# Altium footprint library PcbLib1.PcbLib: 45 footprints (part 1 of 3)
Each footprint in its own frame and in the unit in brackets; x right, y up, seen from the top. Pads: shape width x height; smd on the part's side, far side on the other; paste and mask are expansions set on the pad; w line width, h text height; cw(c..) or ccw(c..) is an arc to the next point about the centre after c.
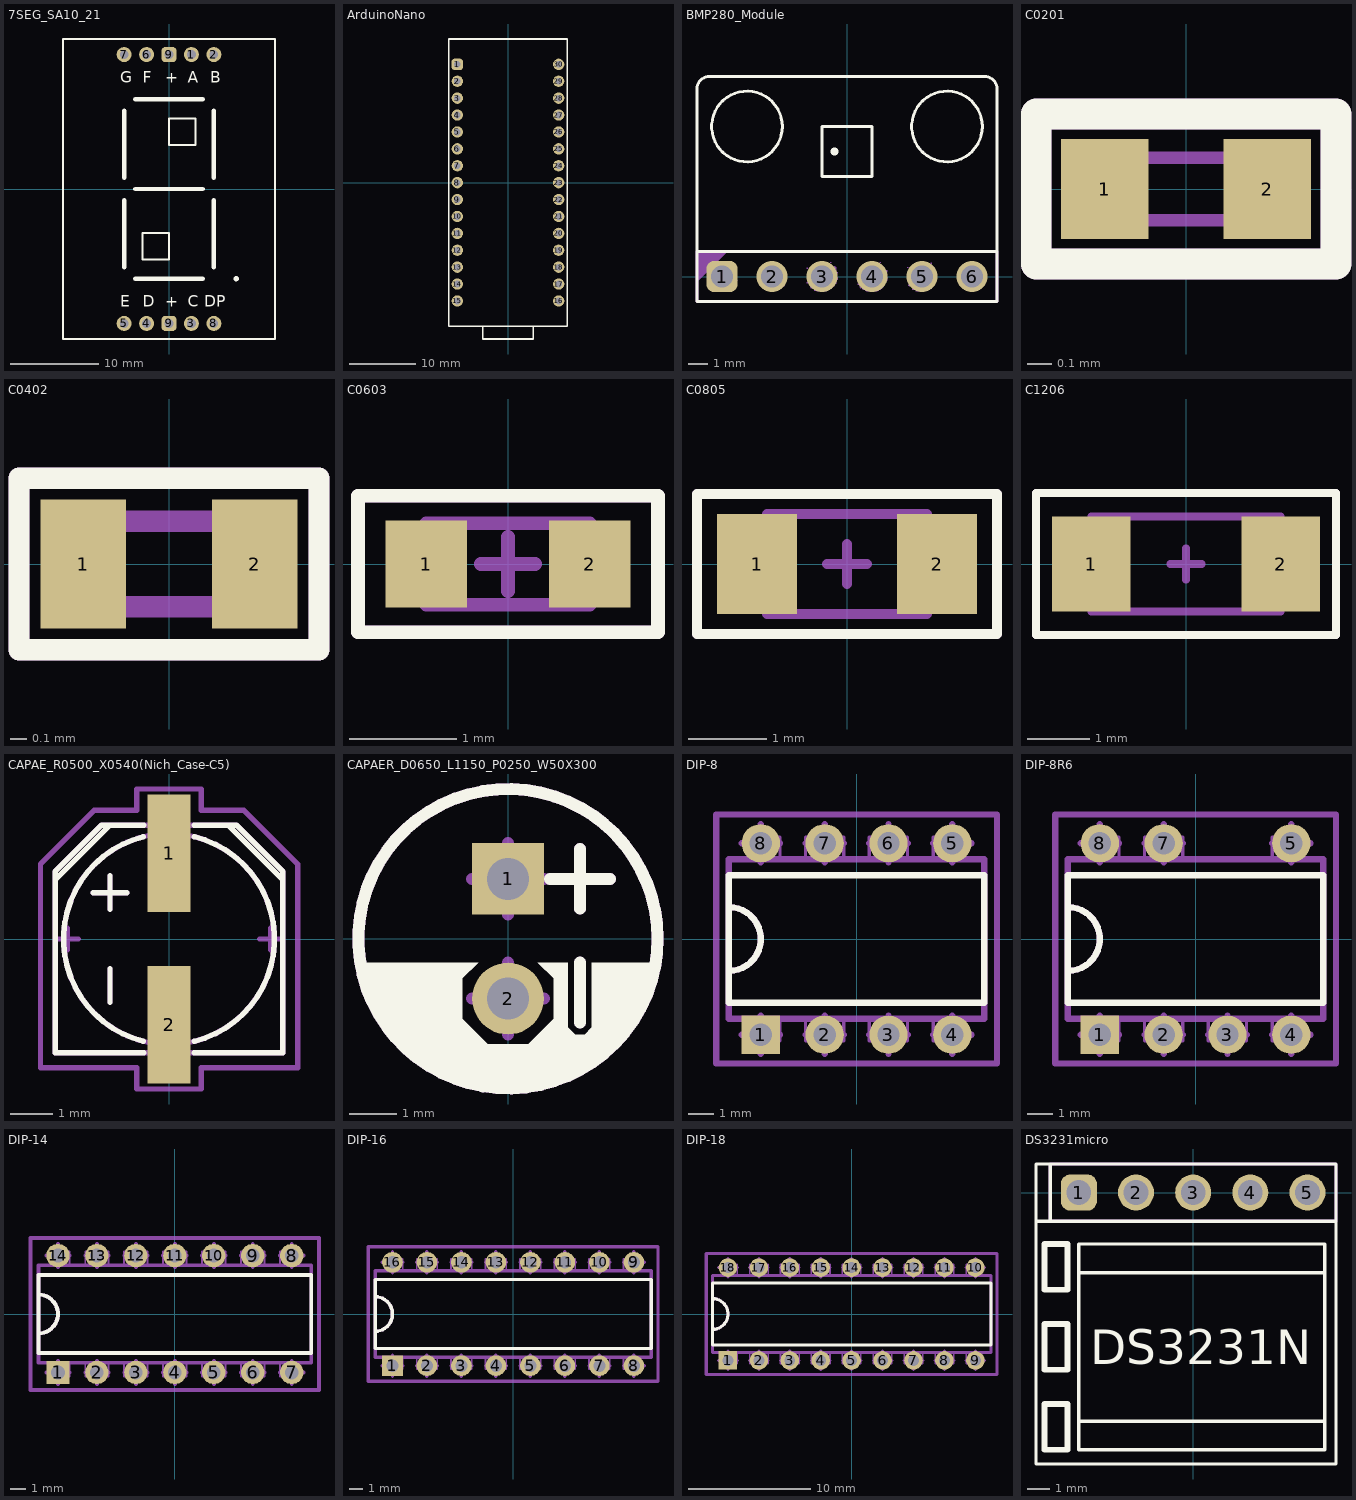
[diagram p0: the footprints below, top view; thin cyan lines are the x and y axes]

## 7SEG_SA10_21 [mm]
pads (10):
  round 1.7 hole 1: 1(2.54,15.24) 2(5.08,15.24) 3(2.54,-15.24) 4(-2.54,-15.24) 5(-5.08,-15.24) 6(-2.54,15.24) 7(-5.08,15.24) 8(5.08,-15.24)
  rrect50% 1.7x1.7 hole 1: 9(0,-15.24) 9(0,15.24)
Top Overlay:
  circle w0.305: c7.62,-10.16 r0.152
  lines w0.254: -12,-17 12,-17 12,17 -12,17 -12,-17 ; -3,-8 -3,-5 0,-5 0,-8 -3,-8 ; 0,5 0,8 3,8 3,5 0,5
  lines w0.508: -5.08,-8.89 -5.08,-1.27 ; -5.08,1.27 -5.08,8.89 ; -3.81,-10.16 3.81,-10.16 ; -3.81,0 3.81,0 ; -3.81,10.16 3.81,10.16 ; 5.08,-8.89 5.08,-1.27 ; 5.08,1.27 5.08,8.89
  text "A" at 2.117,12.065 h1.27
  text "B" at 4.657,12.065 h1.27
  text "C" at 2.117,-13.335 h1.27
  text "D" at -2.963,-13.335 h1.27
  text "E" at -5.503,-13.335 h1.27
  text "F" at -2.963,12.065 h1.27
  text "G" at -5.503,12.065 h1.27
  text "DP" at 4.022,-13.335 h1.27
  text "+" at -0.423,12.065 h1.27
  text "+" at -0.423,-13.335 h1.27

## ArduinoNano [mm]
pads (30):
  rrect50% 1.7x1.7 hole 1: 1(-7.62,17.78)
  round 1.7 hole 1: 2(-7.62,15.24) 3(-7.62,12.7) 4(-7.62,10.16) 5(-7.62,7.62) 6(-7.62,5.08) 7(-7.62,2.54) 8(-7.62,0) 9(-7.62,-2.54) 10(-7.62,-5.08) 11(-7.62,-7.62) 12(-7.62,-10.16) 13(-7.62,-12.7) 14(-7.62,-15.24) 15(-7.62,-17.78) 16(7.62,-17.78) 17(7.62,-15.24) 18(7.62,-12.7) 19(7.62,-10.16) 20(7.62,-7.62) 21(7.62,-5.08) 22(7.62,-2.54) 23(7.62,0) 24(7.62,2.54) 25(7.62,5.08) 26(7.62,7.62) 27(7.62,10.16) 28(7.62,12.7) 29(7.62,15.24) 30(7.62,17.78)
Top Overlay:
  lines w0.15: 3.175,21.59 3.81,21.59
  lines w0.254: -3.81,-21.59 -3.81,-23.495 3.81,-23.495 3.81,-21.59 ; -8.89,-21.59 -8.89,21.59 8.89,21.59 8.89,-21.59 -8.89,-21.59
  text "." at -9.525,18.415 h0.1
3D body "arduino_nano.STEP": height 12.6, standoff -6, extent -9,-23.4 9,21.6

## BMP280_Module [mm]
pads (6):
  rrect50% 1.6x1.6 hole 1.1: 1(-6.35,0)
  round 1.6 hole 1.1: 2(-3.81,0) 3(-1.27,0) 4(1.27,0) 5(3.81,0) 6(6.35,0)
Top Overlay:
  circle w0.15: c-5.08,7.62 r1.796
  circle w0.15: c5.08,7.62 r1.796
  circle w0.381: c-0.635,6.35 r0.003
  lines w0.15: -7.62,1.27 -7.62,9.525 cw(c-6.985,9.525) -6.985,10.16 6.985,10.16 cw(c6.985,9.525) 7.62,9.525 7.62,1.27 ; -7.62,1.27 -7.62,-1.27 7.62,-1.27 7.62,1.27 ; -7.62,1.27 7.62,1.27 ; -1.27,5.08 1.27,5.08 1.27,7.62 -1.27,7.62 -1.27,5.08
Top Courtyard:
  drawing of 113 lines, arcs and shapes, not listed
Top Designator:
  text ".Designator" at -3.999,-0.267 h0.8
Mechanical 29:
  region: -7.62,1.27 -6.096,1.27 -7.62,-0.254
  lines w0.15: -7.62,-1.27 7.62,-1.27 7.62,1.27 -7.62,1.27 -7.62,-1.27
  text ".Designator" at -3.5,-0.3 h1
3D body "PLS-1.STEP": height 8.5, standoff -3, extent -7.62,-1.27 -5.08,1.27
3D body "PLS-1.STEP": height 8.5, standoff -3, extent -5.08,-1.27 -2.54,1.27
3D body "PLS-1.STEP": height 8.5, standoff -3, extent -2.54,-1.27 0,1.27
3D body "PLS-1.STEP": height 8.5, standoff -3, extent 0,-1.27 2.54,1.27
3D body "PLS-1.STEP": height 8.5, standoff -3, extent 2.54,-1.27 5.08,1.27
3D body "PLS-1.STEP": height 8.5, standoff -3, extent 5.08,-1.27 7.62,1.27

## C0201 [mil]
pads (2):
  rect 14x16 smd: 1(-13,0) 2(13,0)
Top Overlay:
  lines w5: -24,-12 24,-12 24,12 -24,12 -24,-12
Bottom 3D Body:
  lines w2: -10,-5 -10,5 10,5 10,-5 -10,-5
  text "'.Designator'" at -8,-2.5 h8
Mechanical 15:
  lines w5: -24,-12 -24,12 24,12 24,-12 -24,-12
3D body "0201C.STEP": height 11.81, standoff 0, extent -11.8,-5.9 11.82,5.91

## C0402 [mil]
pads (2):
  rect 20x30 smd: 1(-20,0) 2(20,0)
Top Overlay:
  lines w5: -35,-20 35,-20 35,20 -35,20 -35,-20
Bottom 3D Body:
  lines w5: -20,-10 20,-10 20,10 -20,10 -20,-10
  text "'.Designator'" at -14,-4 h15
Mechanical 15:
  lines w5: -35,-20 -35,20 35,20 35,-20 -35,-20
3D body "0402C.STEP": height 19.68, standoff 0, extent -19.68,-9.84 19.69,9.85

## C0603 [mil]
pads (2):
  rect 30x32 smd: 1(-30,0) 2(30,0)
Top Overlay:
  lines w5: -55,-25 -55,25 55,25 55,-25 -55,-25
Bottom 3D Body:
  lines w5: -30,-15 30,-15 30,15 -30,15 -30,-15
  text "'.Designator'" at -25,-10 h30
Mechanical 11:
  lines w5: -10,0 10,0 ; 0,-10 0,10
Mechanical 15:
  lines w5: -55,-25 55,-25 55,25 -55,25 -55,-25
3D body "User Library-cap_0603.STEP": height 31.5, standoff 0, extent -31.49,-15.74 31.5,15.75

## C0805 [mil]
pads (2):
  rect 40x50 smd: 1(-45,0) 2(45,0)
Top Overlay:
  lines w5: -75,-35 -75,35 75,35 75,-35 -75,-35
Bottom 3D Body:
  lines w5: -40,-25 -40,25 40,25 40,-25 -40,-25
  text "'.Designator'" at -35,-10 h40
Mechanical 11:
  lines w5: -10,0 10,0 ; 0,-10 0,10
Mechanical 15:
  lines w5: -75,-35 -75,35 75,35 75,-35 -75,-35
3D body "User Library-cap_0805.STEP": height 47.24, standoff 0, extent -39.36,-23.62 39.38,23.63

## C1206 [mil]
pads (2):
  rect 50x60 smd: 1(-60,0) 2(60,0)
Top Overlay:
  lines w5: -95,-45 95,-45 95,45 -95,45 -95,-45
Bottom 3D Body:
  lines w5: -60,-30 60,-30 60,30 -60,30 -60,-30
  text "'.Designator'" at -50,-10 h40
Mechanical 11:
  lines w5: -10,0 10,0 ; 0,-10 0,10
Mechanical 15:
  lines w5: -95,-45 95,-45 95,45 -95,45 -95,-45
3D body "User Library-cap_1206.STEP": height 62.99, standoff 0, extent -62.99,-31.49 63,31.5

## CAPAE_R0500_X0540(Nich_Case-C5) [mil]
pads (2):
  rect 40x110 smd: 1(0,80) 2(0,-80)
Top Overlay:
  lines w5: -106.3,55.12 -55.12,106.3 ; -70.87,43.31 -39.37,43.31 ; -55.12,-59.06 -55.12,-27.56 ; -55.12,27.56 -55.12,59.06 ; -23.87,-95.49 cw(c0,0) -23.87,95.49 ; -23.62,-106.3 -106.3,-106.3 -106.3,62.99 -62.99,106.3 -23.62,106.3 ; 23.62,-106.3 106.3,-106.3 106.3,62.99 62.99,106.3 23.62,106.3 ; 23.64,-95.54 ccw(c0,0) 23.64,95.54 ; 55.12,106.3 106.3,55.12
Bottom 3D Body:
  circle w5: c0,0 r98.43
  lines w2: -12.8,-106.3 -12.8,-120.08 12.8,-120.08 12.8,-106.3 ; -12.8,106.3 -12.8,120.08 12.8,120.08 12.8,106.3
  lines w5: -70.87,43.31 -39.37,43.31 ; -55.12,-59.06 -55.12,-27.56 ; -55.12,27.56 -55.12,59.06 ; -106.3,-106.3 -106.3,62.99 -62.99,106.3 62.99,106.3 106.3,62.99 106.3,-106.3 -106.3,-106.3
  text "'.Designator'" at 59.06,-78.74 h60
Mechanical 11:
  lines w5: -104.69,0 -84.69,0 ; -94.69,-10 -94.69,10 ; 84.69,0 104.69,0 ; 94.69,-10 94.69,10
Mechanical 15:
  lines w5: -120,-120 -120,70 -69.92,120.08 -30,120.08 -30,140 30,140 30,120.08 69.92,120.08 120,70 120,-120 30,-120 30,-140 -30,-140 -30,-120 -120,-120
3D body "C5(D0500H0540).STEP": height 212.99, standoff 0, extent -104.33,-118.11 104.33,118.11

## CAPAER_D0650_L1150_P0250_W50X300 [mil]
pads (2):
  rect 60x60 hole 35: 1(0,50)
  round 60 hole 35: 2(0,-50)
Top Overlay:
  circle w10: c0,0 r125
  region: 124,-20 70,-20 70,-74 64,-80 56,-80 50,-74 50,-20 25,-20 38,-33 38,-67 17,-88 -17,-88 -38,-67 -38,-33 -25,-20 -123,-20 -105,-70 -60,-110 0.5,-125.5 60,-110 106,-70
  lines w10: 35,50 85,50 ; 60,-70 60,-20 ; 60,25 60,75
Bottom 3D Body:
  circle w10: c0,0 r125
  lines w10: 35,50 85,50 ; 60,-70 60,-20 ; 60,25 60,75
  text "'.Designator'" at -80,70 h60
Mechanical 15:
  circle w10: c0,0 r125
Mechanical 25:
  lines w10: -30,-50 30,-50 ; -30,50 30,50 ; 0,-80 0,-20 ; 0,20 0,80
Mechanical 26:
  lines w10: -30,-50 30,-50 ; -30,50 30,50 ; 0,-80 0,-20 ; 0,20 0,80
3D body "User Library-CAPAER_D063_L115_P025_W005X030.STEP": height 453.28, standoff -118.11, extent -124.01,-124.41 124.02,124.01

## DIP-8 [mil]
pads (8):
  rect 60x60 hole 35: 1(-150,-150)
  round 60 hole 35: 2(-50,-150) 3(50,-150) 4(150,-150) 5(150,150) 6(50,150) 7(-50,150) 8(-150,150)
Top Overlay:
  lines w10: -200,-50 ccw(c-200,0) -200,50 ; -200,-100 -200,100 200,100 200,-100 -200,-100
Bottom 3D Body:
  lines w5: -160,-125 -160,-160 -120,-160 -120,-125 ; -160,125 -160,160 -120,160 -120,125 ; -80,-125 -80,-160 -20,-160 -20,-125 ; -80,125 -80,160 -20,160 -20,125 ; 20,-125 20,-160 80,-160 80,-125 ; 20,125 20,160 80,160 80,125 ; 120,-125 120,-160 160,-160 160,-125 ; 120,125 120,160 160,160 160,125
  lines w10: -200,-50 ccw(c-200,0) -200,50 ; -200,-125 -200,125 200,125 200,-125 -200,-125
  text "'.Designator'" at -140,-10 h60
Mechanical 15:
  lines w10: -220,-195 -220,195 220,195 220,-195 -220,-195
Mechanical 25:
  lines w10: -179.9,-150 -119.9,-150 ; -179.9,150 -119.9,150 ; -150,-180 -150,-120 ; -150,120 -150,180 ; -79.9,-150 -19.9,-150 ; -79.9,150 -19.9,150 ; -50,-180 -50,-120 ; -50,120 -50,180 ; 20.1,-150 80.1,-150 ; 20.1,150 80.1,150 ; 50,-180 50,-120 ; 50,120 50,180 ; 120.1,-150 180.1,-150 ; 120.1,150 180.1,150 ; 150,-180 150,-120 ; 150,120 150,180
Mechanical 26:
  lines w10: -179.9,-150 -119.9,-150 ; -179.9,150 -119.9,150 ; -150,-180 -150,-120 ; -150,120 -150,180 ; -79.9,-150 -19.9,-150 ; -79.9,150 -19.9,150 ; -50,-180 -50,-120 ; -50,120 -50,180 ; 20.1,-150 80.1,-150 ; 20.1,150 80.1,150 ; 50,-180 50,-120 ; 50,120 50,180 ; 120.1,-150 180.1,-150 ; 120.1,150 180.1,150 ; 150,-180 150,-120 ; 150,120 150,180
3D body "DIP-8.STEP": height 185.04, standoff -114.96, extent -200.78,-155.7 200.8,155.72

## DIP-8R6 [mil]
pads (7):
  rect 60x60 hole 35: 1(-150,-150)
  round 60 hole 35: 2(-50,-150) 3(50,-150) 4(150,-150) 5(150,150) 7(-50,150) 8(-150,150)
Top Overlay:
  lines w10: -200,-50 ccw(c-200,0) -200,50 ; -200,-100 -200,100 200,100 200,-100 -200,-100
Bottom 3D Body:
  lines w5: -160,-125 -160,-160 -120,-160 -120,-125 ; -160,125 -160,160 -120,160 -120,125 ; -80,-125 -80,-160 -20,-160 -20,-125 ; -80,125 -80,160 -20,160 -20,125 ; 20,-125 20,-160 80,-160 80,-125 ; 120,-125 120,-160 160,-160 160,-125 ; 120,125 120,160 160,160 160,125
  lines w10: -200,-50 ccw(c-200,0) -200,50 ; -200,-125 -200,125 200,125 200,-125 -200,-125
  text "'.Designator'" at -140,-10 h60
Mechanical 15:
  lines w10: -220,-195 -220,195 220,195 220,-195 -220,-195
Mechanical 25:
  lines w10: -179.9,-150 -119.9,-150 ; -179.9,150 -119.9,150 ; -150,-180 -150,-120 ; -150,120 -150,180 ; -79.9,-150 -19.9,-150 ; -79.9,150 -19.9,150 ; -50,-180 -50,-120 ; -50,120 -50,180 ; 20.1,-150 80.1,-150 ; 50,-180 50,-120 ; 120.1,-150 180.1,-150 ; 120.1,150 180.1,150 ; 150,-180 150,-120 ; 150,120 150,180
Mechanical 26:
  lines w10: -179.9,-150 -119.9,-150 ; -179.9,150 -119.9,150 ; -150,-180 -150,-120 ; -150,120 -150,180 ; -79.9,-150 -19.9,-150 ; -79.9,150 -19.9,150 ; -50,-180 -50,-120 ; -50,120 -50,180 ; 20.1,-150 80.1,-150 ; 50,-180 50,-120 ; 120.1,-150 180.1,-150 ; 120.1,150 180.1,150 ; 150,-180 150,-120 ; 150,120 150,180
3D body "DIP-8R6_b.STEP": height 185.04, standoff -114.96, extent -200.78,-155.7 200.8,155.72

## DIP-14 [mil]
pads (14):
  rect 60x60 hole 35: 1(-300,-150)
  round 60 hole 35: 2(-200,-150) 3(-100,-150) 4(0,-150) 5(100,-150) 6(200,-150) 7(300,-150) 8(300,150) 9(200,150) 10(100,150) 11(0,150) 12(-100,150) 13(-200,150) 14(-300,150)
Top Overlay:
  lines w10: -350,-50 ccw(c-350,0) -350,50 ; -350,-100 350,-100 350,100 -350,100 -350,-100
Bottom 3D Body:
  lines w5: -310,-125 -310,-160 -270,-160 -270,-125 ; -310,125 -310,160 -270,160 -270,125 ; -230,-125 -230,-160 -170,-160 -170,-125 ; -230,125 -230,160 -170,160 -170,125 ; -130,-125 -130,-160 -70,-160 -70,-125 ; -130,125 -130,160 -70,160 -70,125 ; -30,-125 -30,-160 30,-160 30,-125 ; -30,125 -30,160 30,160 30,125 ; 70,-125 70,-160 130,-160 130,-125 ; 70,125 70,160 130,160 130,125 ; 170,-125 170,-160 230,-160 230,-125 ; 170,125 170,160 230,160 230,125 ; 270,-125 270,-160 310,-160 310,-125 ; 270,125 270,160 310,160 310,125
  lines w10: -350,-50 ccw(c-350,0) -350,50 ; -350,-125 350,-125 350,125 -350,125 -350,-125
  text "'.Designator'" at -140,-10 h60
Mechanical 15:
  lines w10: -370,-195 370,-195 370,195 -370,195 -370,-195
Mechanical 25:
  lines w10: -329.9,-150 -269.9,-150 ; -329.9,150 -269.9,150 ; -300,-180 -300,-120 ; -300,120 -300,180 ; -229.9,-150 -169.9,-150 ; -229.9,150 -169.9,150 ; -200,-180 -200,-120 ; -200,120 -200,180 ; -129.9,-150 -69.9,-150 ; -129.9,150 -69.9,150 ; -100,-180 -100,-120 ; -100,120 -100,180 ; -29.9,-150 30.1,-150 ; -29.9,150 30.1,150 ; 0,-180 0,-120 ; 0,120 0,180 ; 70.1,-150 130.1,-150 ; 70.1,150 130.1,150 ; 100,-180 100,-120 ; 100,120 100,180 ; 170.1,-150 230.1,-150 ; 170.1,150 230.1,150 ; 200,-180 200,-120 ; 200,120 200,180 ; 270.1,-150 330.1,-150 ; 270.1,150 330.1,150 ; 300,-180 300,-120 ; 300,120 300,180
Mechanical 26:
  lines w10: -329.9,-150 -269.9,-150 ; -329.9,150 -269.9,150 ; -300,-180 -300,-120 ; -300,120 -300,180 ; -229.9,-150 -169.9,-150 ; -229.9,150 -169.9,150 ; -200,-180 -200,-120 ; -200,120 -200,180 ; -129.9,-150 -69.9,-150 ; -129.9,150 -69.9,150 ; -100,-180 -100,-120 ; -100,120 -100,180 ; -29.9,-150 30.1,-150 ; -29.9,150 30.1,150 ; 0,-180 0,-120 ; 0,120 0,180 ; 70.1,-150 130.1,-150 ; 70.1,150 130.1,150 ; 100,-180 100,-120 ; 100,120 100,180 ; 170.1,-150 230.1,-150 ; 170.1,150 230.1,150 ; 200,-180 200,-120 ; 200,120 200,180 ; 270.1,-150 330.1,-150 ; 270.1,150 330.1,150 ; 300,-180 300,-120 ; 300,120 300,180
3D body "DIP-14.STEP": height 185.04, standoff -114.96, extent -350.39,-155.7 350.4,155.72

## DIP-16 [mil]
pads (16):
  rect 60x60 hole 35: 1(-350,-150)
  round 60 hole 35: 2(-250,-150) 3(-150,-150) 4(-50,-150) 5(50,-150) 6(150,-150) 7(250,-150) 8(350,-150) 9(350,150) 10(250,150) 11(150,150) 12(50,150) 13(-50,150) 14(-150,150) 15(-250,150) 16(-350,150)
Top Overlay:
  lines w10: -400,-50 ccw(c-400,0) -400,50 ; -400,-100 -400,100 400,100 400,-100 -400,-100
Bottom 3D Body:
  lines w5: -360,-125 -360,-160 -320,-160 -320,-125 ; -360,125 -360,160 -320,160 -320,125 ; -280,-125 -280,-160 -220,-160 -220,-125 ; -280,125 -280,160 -220,160 -220,125 ; -180,-125 -180,-160 -120,-160 -120,-125 ; -180,125 -180,160 -120,160 -120,125 ; -80,-125 -80,-160 -20,-160 -20,-125 ; -80,125 -80,160 -20,160 -20,125 ; 20,-125 20,-160 80,-160 80,-125 ; 20,125 20,160 80,160 80,125 ; 120,-125 120,-160 180,-160 180,-125 ; 120,125 120,160 180,160 180,125 ; 220,-125 220,-160 280,-160 280,-125 ; 220,125 220,160 280,160 280,125 ; 320,-125 320,-160 360,-160 360,-125 ; 320,125 320,160 360,160 360,125
  lines w10: -400,-50 ccw(c-400,0) -400,50 ; -400,-125 -400,125 400,125 400,-125 -400,-125
  text "'.Designator'" at -140,-10 h60
Mechanical 15:
  lines w10: -420,-195 -420,195 420,195 420,-195 -420,-195
Mechanical 25:
  lines w10: -379.9,-150 -319.9,-150 ; -379.9,150 -319.9,150 ; -350,-180 -350,-120 ; -350,120 -350,180 ; -279.9,-150 -219.9,-150 ; -279.9,150 -219.9,150 ; -250,-180 -250,-120 ; -250,120 -250,180 ; -179.9,-150 -119.9,-150 ; -179.9,150 -119.9,150 ; -150,-180 -150,-120 ; -150,120 -150,180 ; -79.9,-150 -19.9,-150 ; -79.9,150 -19.9,150 ; -50,-180 -50,-120 ; -50,120 -50,180 ; 20.1,-150 80.1,-150 ; 20.1,150 80.1,150 ; 50,-180 50,-120 ; 50,120 50,180 ; 120.1,-150 180.1,-150 ; 120.1,150 180.1,150 ; 150,-180 150,-120 ; 150,120 150,180 ; 220.1,-150 280.1,-150 ; 220.1,150 280.1,150 ; 250,-180 250,-120 ; 250,120 250,180 ; 320.1,-150 380.1,-150 ; 320.1,150 380.1,150 ; 350,-180 350,-120 ; 350,120 350,180
Mechanical 26:
  lines w10: -379.9,-150 -319.9,-150 ; -379.9,150 -319.9,150 ; -350,-180 -350,-120 ; -350,120 -350,180 ; -279.9,-150 -219.9,-150 ; -279.9,150 -219.9,150 ; -250,-180 -250,-120 ; -250,120 -250,180 ; -179.9,-150 -119.9,-150 ; -179.9,150 -119.9,150 ; -150,-180 -150,-120 ; -150,120 -150,180 ; -79.9,-150 -19.9,-150 ; -79.9,150 -19.9,150 ; -50,-180 -50,-120 ; -50,120 -50,180 ; 20.1,-150 80.1,-150 ; 20.1,150 80.1,150 ; 50,-180 50,-120 ; 50,120 50,180 ; 120.1,-150 180.1,-150 ; 120.1,150 180.1,150 ; 150,-180 150,-120 ; 150,120 150,180 ; 220.1,-150 280.1,-150 ; 220.1,150 280.1,150 ; 250,-180 250,-120 ; 250,120 250,180 ; 320.1,-150 380.1,-150 ; 320.1,150 380.1,150 ; 350,-180 350,-120 ; 350,120 350,180
3D body "DIP-16.STEP": height 185.04, standoff -114.96, extent -401.57,-155.7 401.58,155.72

## DIP-18 [mil]
pads (18):
  rect 60x60 hole 35: 1(-400,-150)
  round 60 hole 35: 2(-300,-150) 3(-200,-150) 4(-100,-150) 5(0,-150) 6(100,-150) 7(200,-150) 8(300,-150) 9(400,-150) 10(400,150) 11(300,150) 12(200,150) 13(100,150) 14(0,150) 15(-100,150) 16(-200,150) 17(-300,150) 18(-400,150)
Top Overlay:
  lines w10: -450,-50 ccw(c-450,0) -450,50 ; -450,-100 450,-100 450,100 -450,100 -450,-100
Bottom 3D Body:
  lines w5: -410,-125 -410,-160 -370,-160 -370,-125 ; -410,125 -410,160 -370,160 -370,125 ; -330,-125 -330,-160 -270,-160 -270,-125 ; -330,125 -330,160 -270,160 -270,125 ; -230,-125 -230,-160 -170,-160 -170,-125 ; -230,125 -230,160 -170,160 -170,125 ; -130,-125 -130,-160 -70,-160 -70,-125 ; -130,125 -130,160 -70,160 -70,125 ; -30,-125 -30,-160 30,-160 30,-125 ; -30,125 -30,160 30,160 30,125 ; 70,-125 70,-160 130,-160 130,-125 ; 70,125 70,160 130,160 130,125 ; 170,-125 170,-160 230,-160 230,-125 ; 170,125 170,160 230,160 230,125 ; 270,-125 270,-160 330,-160 330,-125 ; 270,125 270,160 330,160 330,125 ; 370,-125 370,-160 410,-160 410,-125 ; 370,125 370,160 410,160 410,125
  lines w10: -450,-50 ccw(c-450,0) -450,50 ; -450,-125 450,-125 450,125 -450,125 -450,-125
  text "'.Designator'" at -140,-10 h60
Mechanical 15:
  lines w10: -470,-195 470,-195 470,195 -470,195 -470,-195
Mechanical 25:
  lines w10: -429.9,-150 -369.9,-150 ; -429.9,150 -369.9,150 ; -400,-180 -400,-120 ; -400,120 -400,180 ; -329.9,-150 -269.9,-150 ; -329.9,150 -269.9,150 ; -300,-180 -300,-120 ; -300,120 -300,180 ; -229.9,-150 -169.9,-150 ; -229.9,150 -169.9,150 ; -200,-180 -200,-120 ; -200,120 -200,180 ; -129.9,-150 -69.9,-150 ; -129.9,150 -69.9,150 ; -100,-180 -100,-120 ; -100,120 -100,180 ; -29.9,-150 30.1,-150 ; -29.9,150 30.1,150 ; 0,-180 0,-120 ; 0,120 0,180 ; 70.1,-150 130.1,-150 ; 70.1,150 130.1,150 ; 100,-180 100,-120 ; 100,120 100,180 ; 170.1,-150 230.1,-150 ; 170.1,150 230.1,150 ; 200,-180 200,-120 ; 200,120 200,180 ; 270.1,-150 330.1,-150 ; 270.1,150 330.1,150 ; 300,-180 300,-120 ; 300,120 300,180 ; 370.1,-150 430.1,-150 ; 370.1,150 430.1,150 ; 400,-180 400,-120 ; 400,120 400,180
Mechanical 26:
  lines w10: -429.9,-150 -369.9,-150 ; -429.9,150 -369.9,150 ; -400,-180 -400,-120 ; -400,120 -400,180 ; -329.9,-150 -269.9,-150 ; -329.9,150 -269.9,150 ; -300,-180 -300,-120 ; -300,120 -300,180 ; -229.9,-150 -169.9,-150 ; -229.9,150 -169.9,150 ; -200,-180 -200,-120 ; -200,120 -200,180 ; -129.9,-150 -69.9,-150 ; -129.9,150 -69.9,150 ; -100,-180 -100,-120 ; -100,120 -100,180 ; -29.9,-150 30.1,-150 ; -29.9,150 30.1,150 ; 0,-180 0,-120 ; 0,120 0,180 ; 70.1,-150 130.1,-150 ; 70.1,150 130.1,150 ; 100,-180 100,-120 ; 100,120 100,180 ; 170.1,-150 230.1,-150 ; 170.1,150 230.1,150 ; 200,-180 200,-120 ; 200,120 200,180 ; 270.1,-150 330.1,-150 ; 270.1,150 330.1,150 ; 300,-180 300,-120 ; 300,120 300,180 ; 370.1,-150 430.1,-150 ; 370.1,150 430.1,150 ; 400,-180 400,-120 ; 400,120 400,180
3D body "DIP-18.STEP": height 185.04, standoff -114.96, extent -450.78,-155.7 450.79,155.72

## DS3231micro [mm]
pads (5):
  rrect50% 1.6x1.6 hole 1.1: 1(-5.08,0)
  round 1.6 hole 1.1: 2(-2.54,0) 3(0,0) 4(2.54,0) 5(5.08,0)
Top Overlay:
  lines w0.15: -6.985,-1.27 -6.985,-12.065 6.35,-12.065 6.35,-1.27 ; -6.985,-1.27 -6.985,1.27 -6.35,1.27 ; -6.985,-1.27 6.35,-1.27 ; -6.35,1.27 -6.35,-1.27 6.35,-1.27 ; -6.35,1.27 6.35,1.27 6.35,-1.27 ; -5.08,-11.43 5.842,-11.43 5.842,-2.286 -5.08,-2.286 -5.08,-11.43 ; -5.08,-10.16 5.842,-10.16 5.842,-3.556 -5.08,-3.556 -5.08,-10.16
  lines w0.254: -6.604,-11.43 -5.588,-11.43 -5.588,-9.398 -6.604,-9.398 -6.604,-11.43 ; -6.604,-7.874 -5.588,-7.874 -5.588,-5.842 -6.604,-5.842 -6.604,-7.874 ; -6.604,-4.318 -5.588,-4.318 -5.588,-2.286 -6.604,-2.286 -6.604,-4.318
  text "DS3231N" at -4.572,-7.62 h1.52
  text "." at -6.35,1.778 h0.1
Mechanical 29:
  lines w0.15: -6.35,-1.27 6.35,-1.27 6.35,1.27 -6.35,1.27 -6.35,-1.27
3D body "PLS-1.STEP": height 8.5, standoff -3, extent -6.35,-1.27 -3.81,1.27
3D body "PLS-1.STEP": height 8.5, standoff -3, extent -3.81,-1.27 -1.27,1.27
3D body "PLS-1.STEP": height 8.5, standoff -3, extent -1.27,-1.27 1.27,1.27
3D body "PLS-1.STEP": height 8.5, standoff -3, extent 1.27,-1.27 3.81,1.27
3D body "PLS-1.STEP": height 8.5, standoff -3, extent 3.81,-1.27 6.35,1.27